# Altium footprint library Connectors THD.PcbLib: 631 footprints (part 41 of 46)
Each footprint in its own frame and in the unit in brackets; x right, y up, seen from the top. Pads: shape width x height; smd on the part's side, far side on the other; paste and mask are expansions set on the pad; w line width, h text height; cw(c..) or ccw(c..) is an arc to the next point about the centre after c.
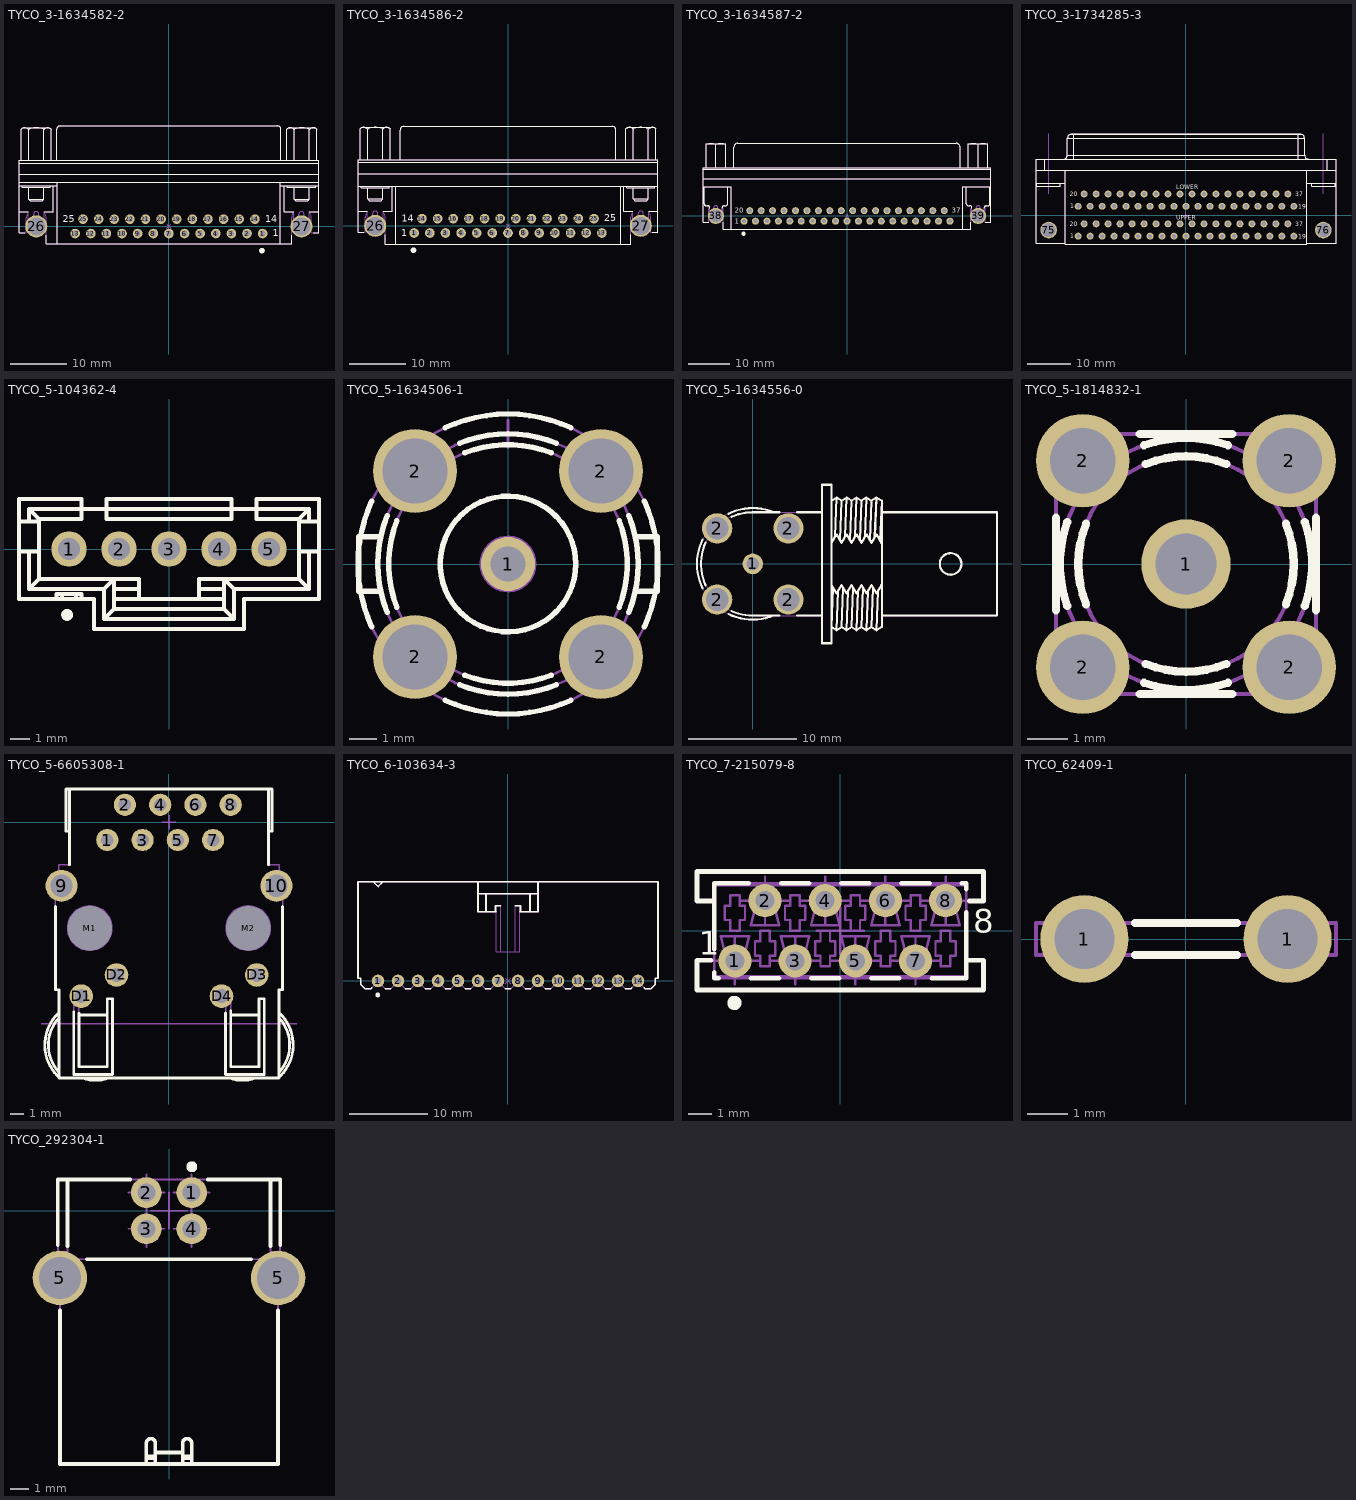
[diagram p40: the footprints below, top view; thin cyan lines are the x and y axes]

## TYCO_3-1634582-2 [mm] "Right Angle 25 Male Contacts D-SUB Connector With Boardlock and 4-40 UNC Screwlocks"
height 13.575
pads (27):
  round 1.7 hole 1: 1(16.62,-1.27) 2(13.85,-1.27) 3(11.08,-1.27) 4(8.31,-1.27) 5(5.54,-1.27) 6(2.77,-1.27) 7(0,-1.27) 8(-2.77,-1.27) 9(-5.54,-1.27) 10(-8.31,-1.27) 11(-11.08,-1.27) 12(-13.85,-1.27) 13(-16.62,-1.27) 14(15.235,1.27) 15(12.465,1.27) 16(9.695,1.27) 17(6.925,1.27) 18(4.155,1.27) 19(1.385,1.27) 20(-1.385,1.27) 21(-4.155,1.27) 22(-6.925,1.27) 23(-9.695,1.27) 24(-12.465,1.27) 25(-15.235,1.27)
  round 3.9 hole 3.2: 26(-23.52,0) 27(23.52,0)
Top Overlay:
  circle w0.5: c16.495,-4.305 r0.25
  lines w0.2: -26.567,2.62 -24.927,2.62 ; -26.567,7.21 -19.772,7.21 ; -26.567,7.85 26.533,7.85 ; -26.567,11.23 26.533,11.23 ; -26.525,9.2 26.533,9.2 ; -26.187,11.7 -26.187,17.2 -25.887,17.5 -21.187,17.5 -20.889,17.2 ; -26.184,17.2 cw(c-25.495,16.568) -25.572,17.5 cw(c-25.649,16.568) -24.959,17.2 -24.761,17.2 cw(c-23.537,14.767) -22.312,17.2 -22.114,17.2 cw(c-21.424,16.568) -21.501,17.5 cw(c-21.579,16.568) -20.889,17.2 ; -26.037,7.21 -26.037,6.96 -21.037,6.96 -21.037,7.21 ; -25.569,-1.15 -26.567,-1.15 -26.567,11.7 26.533,11.7 26.533,-1.15 25.569,-1.15 ; -24.877,6.96 -24.877,4.8 ; -24.862,11.7 -24.862,17.2 ; -22.212,11.7 -22.212,17.2 ; -22.197,6.96 -22.197,4.8 ; -22.147,2.62 -20.507,2.62 -20.507,7.21 ; -21.777,-1.576 -21.777,-3.08 21.743,-3.08 21.743,-1.538 ; -20.889,11.7 -20.889,17.2 ; -19.894,11.7 -19.894,17.2 cw(c-19.294,17.2) -19.294,17.8 19.263,17.8 cw(c19.263,17.2) 19.863,17.2 19.863,11.7 ; -19.772,-3.08 -19.772,7.85 ; 19.738,-3.08 19.738,7.85 ; 19.738,7.21 26.533,7.21 ; 20.473,7.21 20.473,2.62 22.113,2.62 ; 20.913,11.7 20.913,17.209 21.213,17.509 25.913,17.509 26.211,17.209 ; 20.916,17.209 cw(c21.605,16.577) 21.528,17.509 cw(c21.451,16.577) 22.141,17.209 22.339,17.209 cw(c23.563,14.777) 24.788,17.209 24.986,17.209 cw(c25.676,16.577) 25.599,17.509 cw(c25.522,16.577) 26.211,17.209 ; 21.003,7.21 21.003,6.96 26.003,6.96 26.003,7.21 ; 22.223,6.96 22.223,4.8 ; 22.238,11.7 22.238,17.209 ; 24.888,11.7 24.888,17.209 ; 24.893,2.62 26.533,2.62 ; 24.903,6.96 24.903,4.8 ; 26.211,11.7 26.211,17.209 ; -24.877,4.8 -24.577,4.5 -22.497,4.5 -22.197,4.8 ; -24.877,4.8 -22.197,4.8 ; 22.223,4.8 22.523,4.5 24.603,4.5 24.903,4.8 ; 22.223,4.8 24.903,4.8
  text "14" at 17.04,0.77 h1.2
  text "25" at -18.86,0.72 h1.2
  text "1" at 18.425,-1.77 h1.2
Mechanical 8:
  lines w0.1: -24.02,0 -23.52,0 ; -23.52,-0.5 -23.52,0 ; -23.52,0.5 -23.52,0 ; -23.02,0 -23.52,0 ; -17.12,-1.27 -16.62,-1.27 ; -16.62,-1.77 -16.62,-1.27 ; -16.62,-0.77 -16.62,-1.27 ; -16.12,-1.27 -16.62,-1.27 ; -15.735,1.27 -15.235,1.27 ; -15.235,0.77 -15.235,1.27 ; -15.235,1.77 -15.235,1.27 ; -14.735,1.27 -15.235,1.27 ; -14.35,-1.27 -13.85,-1.27 ; -13.85,-1.77 -13.85,-1.27 ; -13.85,-0.77 -13.85,-1.27 ; -13.35,-1.27 -13.85,-1.27 ; -12.965,1.27 -12.465,1.27 ; -12.465,0.77 -12.465,1.27 ; -12.465,1.77 -12.465,1.27 ; -11.965,1.27 -12.465,1.27 ; -11.58,-1.27 -11.08,-1.27 ; -11.08,-1.77 -11.08,-1.27 ; -11.08,-0.77 -11.08,-1.27 ; -10.58,-1.27 -11.08,-1.27 ; -10.195,1.27 -9.695,1.27 ; -9.695,0.77 -9.695,1.27 ; -9.695,1.77 -9.695,1.27 ; -9.195,1.27 -9.695,1.27 ; -8.81,-1.27 -8.31,-1.27 ; -8.31,-1.77 -8.31,-1.27 ; -8.31,-0.77 -8.31,-1.27 ; -7.81,-1.27 -8.31,-1.27 ; -7.425,1.27 -6.925,1.27 ; -6.925,0.77 -6.925,1.27 ; -6.925,1.77 -6.925,1.27 ; -6.425,1.27 -6.925,1.27 ; -6.04,-1.27 -5.54,-1.27 ; -5.54,-1.77 -5.54,-1.27 ; -5.54,-0.77 -5.54,-1.27 ; -5.04,-1.27 -5.54,-1.27 ; -4.655,1.27 -4.155,1.27 ; -4.155,0.77 -4.155,1.27 ; -4.155,1.77 -4.155,1.27 ; -3.655,1.27 -4.155,1.27 ; -3.27,-1.27 -2.77,-1.27 ; -2.77,-1.77 -2.77,-1.27 ; -2.77,-0.77 -2.77,-1.27 ; -2.27,-1.27 -2.77,-1.27 ; -1.885,1.27 -1.385,1.27 ; -1.385,0.77 -1.385,1.27 ; -1.385,1.77 -1.385,1.27 ; -0.885,1.27 -1.385,1.27 ; -0.5,-1.27 0,-1.27 ; -0.354,-0.354 0,0 ; -0.354,0.354 0,0 ; 0,-1.77 0,-1.27 ; 0,-0.77 0,-1.27 ; 0.354,-0.354 0,0 ; 0.354,0.354 0,0 ; 0.5,-1.27 0,-1.27 ; 0.885,1.27 1.385,1.27 ; 1.385,0.77 1.385,1.27 ; 1.385,1.77 1.385,1.27 ; 1.885,1.27 1.385,1.27 ; 2.27,-1.27 2.77,-1.27 ; 2.77,-1.77 2.77,-1.27 ; 2.77,-0.77 2.77,-1.27 ; 3.27,-1.27 2.77,-1.27 ; 3.655,1.27 4.155,1.27 ; 4.155,0.77 4.155,1.27 ; 4.155,1.77 4.155,1.27 ; 4.655,1.27 4.155,1.27 ; 5.04,-1.27 5.54,-1.27 ; 5.54,-1.77 5.54,-1.27 ; 5.54,-0.77 5.54,-1.27 ; 6.04,-1.27 5.54,-1.27 ; 6.425,1.27 6.925,1.27 ; 6.925,0.77 6.925,1.27 ; 6.925,1.77 6.925,1.27 ; 7.425,1.27 6.925,1.27 ; 7.81,-1.27 8.31,-1.27 ; 8.31,-1.77 8.31,-1.27 ; 8.31,-0.77 8.31,-1.27 ; 8.81,-1.27 8.31,-1.27 ; 9.195,1.27 9.695,1.27 ; 9.695,0.77 9.695,1.27 ; 9.695,1.77 9.695,1.27 ; 10.195,1.27 9.695,1.27 ; 10.58,-1.27 11.08,-1.27 ; 11.08,-1.77 11.08,-1.27 ; 11.08,-0.77 11.08,-1.27 ; 11.58,-1.27 11.08,-1.27 ; 11.965,1.27 12.465,1.27 ; 12.465,0.77 12.465,1.27 ; 12.465,1.77 12.465,1.27 ; 12.965,1.27 12.465,1.27 ; 13.35,-1.27 13.85,-1.27 ; 13.85,-1.77 13.85,-1.27 ; 13.85,-0.77 13.85,-1.27 ; 14.35,-1.27 13.85,-1.27 ; 14.735,1.27 15.235,1.27 ; 15.235,0.77 15.235,1.27 ; 15.235,1.77 15.235,1.27 ; 15.735,1.27 15.235,1.27 ; 16.12,-1.27 16.62,-1.27 ; 16.62,-1.77 16.62,-1.27 ; 16.62,-0.77 16.62,-1.27 ; 17.12,-1.27 16.62,-1.27 ; 23.02,0 23.52,0 ; 23.52,-0.5 23.52,0 ; 23.52,0.5 23.52,0 ; 24.02,0 23.52,0
Mechanical 14:
  lines w0.1: -26.567,2.62 -24.927,2.62 -24.927,-0.32 -23.987,-0.32 -23.987,2.17 cw(c-23.537,2.17) -23.087,2.17 -23.087,-0.32 -22.147,-0.32 -22.147,2.62 -20.507,2.62 -20.507,7.21 ; -26.567,7.21 -19.772,7.21 ; -26.567,7.85 26.533,7.85 ; -26.567,11.23 26.533,11.23 ; -26.525,9.2 26.533,9.2 ; -26.187,11.7 -26.187,17.2 -25.887,17.5 -21.187,17.5 -20.889,17.2 ; -26.184,17.2 cw(c-25.495,16.568) -25.572,17.5 cw(c-25.649,16.568) -24.959,17.2 -24.761,17.2 cw(c-23.537,14.767) -22.312,17.2 -22.114,17.2 cw(c-21.424,16.568) -21.501,17.5 cw(c-21.579,16.568) -20.889,17.2 ; -26.037,7.21 -26.037,6.96 -21.037,6.96 -21.037,7.21 ; -24.927,2.6 ccw(c-23.537,1.52) -25.297,1.52 -25.297,-1.15 -26.567,-1.15 -26.567,11.7 26.533,11.7 26.533,-1.15 25.263,-1.15 25.263,1.52 ccw(c23.503,1.52) 24.893,2.6 ; -24.877,6.96 -24.877,4.8 ; -24.862,11.7 -24.862,17.2 ; -22.212,11.7 -22.212,17.2 ; -22.197,6.96 -22.197,4.8 ; -22.147,2.6 cw(c-23.537,1.52) -21.777,1.52 -21.777,-3.08 21.743,-3.08 21.743,1.52 cw(c23.503,1.52) 22.113,2.6 ; -20.889,11.7 -20.889,17.2 ; -19.894,11.7 -19.894,17.2 cw(c-19.294,17.2) -19.294,17.8 19.263,17.8 cw(c19.263,17.2) 19.863,17.2 19.863,11.7 ; -19.772,-3.08 -19.772,7.85 ; 19.738,-3.08 19.738,7.85 ; 19.738,7.21 26.533,7.21 ; 20.473,7.21 20.473,2.62 22.113,2.62 22.113,-0.318 23.053,-0.32 23.053,2.17 cw(c23.503,2.17) 23.953,2.17 23.953,-0.32 24.893,-0.32 24.893,2.62 26.533,2.62 ; 20.913,11.7 20.913,17.209 21.213,17.509 25.913,17.509 26.211,17.209 ; 20.916,17.209 cw(c21.605,16.577) 21.528,17.509 cw(c21.451,16.577) 22.141,17.209 22.339,17.209 cw(c23.563,14.777) 24.788,17.209 24.986,17.209 cw(c25.676,16.577) 25.599,17.509 cw(c25.522,16.577) 26.211,17.209 ; 21.003,7.21 21.003,6.96 26.003,6.96 26.003,7.21 ; 22.223,6.96 22.223,4.8 ; 22.238,11.7 22.238,17.209 ; 24.888,11.7 24.888,17.209 ; 24.903,6.96 24.903,4.8 ; 26.211,11.7 26.211,17.209 ; -24.877,4.8 -24.577,4.5 -22.497,4.5 -22.197,4.8 ; -24.877,4.8 -22.197,4.8 ; 22.223,4.8 22.523,4.5 24.603,4.5 24.903,4.8 ; 22.223,4.8 24.903,4.8
  text "14" at 17.04,0.77 h1.2
  text "25" at -18.86,0.72 h1.2
  text "1" at 18.425,-1.77 h1.2
3D body: height 13.57, standoff -3.8, extent -26.567,-3.08 26.533,17.8

## TYCO_3-1634586-2 [mm] "Right Angle 25 Female Contacts D-SUB Connector With Boardlock and 4-40 UNC Screwlocks"
height 13.575
pads (27):
  round 1.7 hole 1: 1(-16.62,-1.27) 2(-13.85,-1.27) 3(-11.08,-1.27) 4(-8.31,-1.27) 5(-5.54,-1.27) 6(-2.77,-1.27) 7(0,-1.27) 8(2.77,-1.27) 9(5.54,-1.27) 10(8.31,-1.27) 11(11.08,-1.27) 12(13.85,-1.27) 13(16.62,-1.27) 14(-15.235,1.27) 15(-12.465,1.27) 16(-9.695,1.27) 17(-6.925,1.27) 18(-4.155,1.27) 19(-1.385,1.27) 20(1.385,1.27) 21(4.155,1.27) 22(6.925,1.27) 23(9.695,1.27) 24(12.465,1.27) 25(15.235,1.27)
  round 3.9 hole 3.2: 26(-23.52,0) 27(23.52,0)
Top Overlay:
  circle w0.5: c-16.745,-4.305 r0.25
  lines w0.2: -26.55,2.62 -24.91,2.62 ; -26.55,7.01 26.55,7.01 ; -26.55,11.23 26.55,11.23 ; -26.508,9.2 26.55,9.2 ; -26.17,11.7 -26.17,17.15 -25.87,17.45 -21.17,17.45 -20.872,17.15 ; -26.168,17.15 cw(c-25.478,16.518) -25.555,17.45 cw(c-25.632,16.518) -24.943,17.15 -24.745,17.15 cw(c-23.52,14.717) -22.295,17.15 -22.097,17.15 cw(c-21.408,16.518) -21.485,17.45 cw(c-21.562,16.518) -20.872,17.15 ; -26.02,7.01 -26.02,6.76 -21.02,6.76 -21.02,7.01 ; -25.569,-1.15 -26.55,-1.15 -26.55,11.7 26.55,11.7 26.55,-1.15 25.569,-1.15 ; -24.86,6.76 -24.86,4.76 ; -24.845,11.7 -24.845,17.15 ; -22.195,11.7 -22.195,17.15 ; -22.18,6.76 -22.18,4.76 ; -22.13,2.62 -20.49,2.62 -20.49,7.01 ; -21.76,-1.557 -21.76,-3.28 21.76,-3.28 21.76,-1.557 ; -20.872,11.7 -20.872,17.15 ; -19.89,-3.28 -19.89,7.01 ; -19.11,11.7 -19.11,16.93 cw(c-18.445,16.935) -18.45,17.6 18.45,17.6 cw(c18.445,16.935) 19.11,16.93 19.11,11.7 ; 19.93,-3.28 19.93,7.01 ; 20.49,7.01 20.49,2.62 22.13,2.62 ; 20.87,11.7 20.87,17.15 21.17,17.45 25.87,17.45 26.168,17.15 ; 20.872,17.15 cw(c21.562,16.518) 21.485,17.45 cw(c21.408,16.518) 22.097,17.15 22.295,17.15 cw(c23.52,14.717) 24.745,17.15 24.943,17.15 cw(c25.632,16.518) 25.555,17.45 cw(c25.478,16.518) 26.168,17.15 ; 21.02,7.01 21.02,6.76 26.02,6.76 26.02,7.01 ; 22.18,6.76 22.18,4.76 ; 22.195,11.7 22.195,17.15 ; 24.845,11.7 24.845,17.15 ; 24.86,6.76 24.86,4.76 ; 24.91,2.62 26.55,2.62 ; 26.168,11.7 26.168,17.15 ; -24.86,4.76 -22.18,4.76 ; -24.86,4.76 -24.56,4.46 -22.48,4.46 -22.18,4.76 ; 22.18,4.76 24.86,4.76 ; 22.18,4.76 22.48,4.46 24.56,4.46 24.86,4.76
  text "25" at 17.04,0.77 h1.2
  text "14" at -18.86,0.72 h1.2
  text "1" at -18.885,-1.88 h1.2
Mechanical 8:
  lines w0.1: -24.02,0 -23.52,0 ; -23.52,-0.5 -23.52,0 ; -23.52,0.5 -23.52,0 ; -23.02,0 -23.52,0 ; -17.12,-1.27 -16.62,-1.27 ; -16.62,-1.77 -16.62,-1.27 ; -16.62,-0.77 -16.62,-1.27 ; -16.12,-1.27 -16.62,-1.27 ; -15.735,1.27 -15.235,1.27 ; -15.235,0.77 -15.235,1.27 ; -15.235,1.77 -15.235,1.27 ; -14.735,1.27 -15.235,1.27 ; -14.35,-1.27 -13.85,-1.27 ; -13.85,-1.77 -13.85,-1.27 ; -13.85,-0.77 -13.85,-1.27 ; -13.35,-1.27 -13.85,-1.27 ; -12.965,1.27 -12.465,1.27 ; -12.465,0.77 -12.465,1.27 ; -12.465,1.77 -12.465,1.27 ; -11.965,1.27 -12.465,1.27 ; -11.58,-1.27 -11.08,-1.27 ; -11.08,-1.77 -11.08,-1.27 ; -11.08,-0.77 -11.08,-1.27 ; -10.58,-1.27 -11.08,-1.27 ; -10.195,1.27 -9.695,1.27 ; -9.695,0.77 -9.695,1.27 ; -9.695,1.77 -9.695,1.27 ; -9.195,1.27 -9.695,1.27 ; -8.81,-1.27 -8.31,-1.27 ; -8.31,-1.77 -8.31,-1.27 ; -8.31,-0.77 -8.31,-1.27 ; -7.81,-1.27 -8.31,-1.27 ; -7.425,1.27 -6.925,1.27 ; -6.925,0.77 -6.925,1.27 ; -6.925,1.77 -6.925,1.27 ; -6.425,1.27 -6.925,1.27 ; -6.04,-1.27 -5.54,-1.27 ; -5.54,-1.77 -5.54,-1.27 ; -5.54,-0.77 -5.54,-1.27 ; -5.04,-1.27 -5.54,-1.27 ; -4.655,1.27 -4.155,1.27 ; -4.155,0.77 -4.155,1.27 ; -4.155,1.77 -4.155,1.27 ; -3.655,1.27 -4.155,1.27 ; -3.27,-1.27 -2.77,-1.27 ; -2.77,-1.77 -2.77,-1.27 ; -2.77,-0.77 -2.77,-1.27 ; -2.27,-1.27 -2.77,-1.27 ; -1.885,1.27 -1.385,1.27 ; -1.385,0.77 -1.385,1.27 ; -1.385,1.77 -1.385,1.27 ; -0.885,1.27 -1.385,1.27 ; -0.5,-1.27 0,-1.27 ; -0.354,-0.354 0,0 ; -0.354,0.354 0,0 ; 0,-1.77 0,-1.27 ; 0,-0.77 0,-1.27 ; 0.354,-0.354 0,0 ; 0.354,0.354 0,0 ; 0.5,-1.27 0,-1.27 ; 0.885,1.27 1.385,1.27 ; 1.385,0.77 1.385,1.27 ; 1.385,1.77 1.385,1.27 ; 1.885,1.27 1.385,1.27 ; 2.27,-1.27 2.77,-1.27 ; 2.77,-1.77 2.77,-1.27 ; 2.77,-0.77 2.77,-1.27 ; 3.27,-1.27 2.77,-1.27 ; 3.655,1.27 4.155,1.27 ; 4.155,0.77 4.155,1.27 ; 4.155,1.77 4.155,1.27 ; 4.655,1.27 4.155,1.27 ; 5.04,-1.27 5.54,-1.27 ; 5.54,-1.77 5.54,-1.27 ; 5.54,-0.77 5.54,-1.27 ; 6.04,-1.27 5.54,-1.27 ; 6.425,1.27 6.925,1.27 ; 6.925,0.77 6.925,1.27 ; 6.925,1.77 6.925,1.27 ; 7.425,1.27 6.925,1.27 ; 7.81,-1.27 8.31,-1.27 ; 8.31,-1.77 8.31,-1.27 ; 8.31,-0.77 8.31,-1.27 ; 8.81,-1.27 8.31,-1.27 ; 9.195,1.27 9.695,1.27 ; 9.695,0.77 9.695,1.27 ; 9.695,1.77 9.695,1.27 ; 10.195,1.27 9.695,1.27 ; 10.58,-1.27 11.08,-1.27 ; 11.08,-1.77 11.08,-1.27 ; 11.08,-0.77 11.08,-1.27 ; 11.58,-1.27 11.08,-1.27 ; 11.965,1.27 12.465,1.27 ; 12.465,0.77 12.465,1.27 ; 12.465,1.77 12.465,1.27 ; 12.965,1.27 12.465,1.27 ; 13.35,-1.27 13.85,-1.27 ; 13.85,-1.77 13.85,-1.27 ; 13.85,-0.77 13.85,-1.27 ; 14.35,-1.27 13.85,-1.27 ; 14.735,1.27 15.235,1.27 ; 15.235,0.77 15.235,1.27 ; 15.235,1.77 15.235,1.27 ; 15.735,1.27 15.235,1.27 ; 16.12,-1.27 16.62,-1.27 ; 16.62,-1.77 16.62,-1.27 ; 16.62,-0.77 16.62,-1.27 ; 17.12,-1.27 16.62,-1.27 ; 23.02,0 23.52,0 ; 23.52,-0.5 23.52,0 ; 23.52,0.5 23.52,0 ; 24.02,0 23.52,0
Mechanical 14:
  lines w0.1: -26.55,2.62 -24.91,2.62 -24.91,-0.318 -23.97,-0.32 -23.97,2.17 cw(c-23.52,2.17) -23.07,2.17 -23.07,-0.316 -22.13,-0.32 -22.13,2.62 -20.49,2.62 -20.49,7.01 ; -26.55,7.01 26.55,7.01 ; -26.55,11.23 26.55,11.23 ; -26.508,9.2 26.55,9.2 ; -26.17,11.7 -26.17,17.15 -25.87,17.45 -21.17,17.45 -20.872,17.15 ; -26.168,17.15 cw(c-25.478,16.518) -25.555,17.45 cw(c-25.632,16.518) -24.943,17.15 -24.745,17.15 cw(c-23.52,14.717) -22.295,17.15 -22.097,17.15 cw(c-21.408,16.518) -21.485,17.45 cw(c-21.562,16.518) -20.872,17.15 ; -26.02,7.01 -26.02,6.76 -21.02,6.76 -21.02,7.01 ; -24.91,2.6 ccw(c-23.52,1.52) -25.28,1.52 -25.28,-1.15 -26.55,-1.15 -26.55,11.7 26.55,11.7 26.55,-1.15 25.28,-1.15 25.28,1.52 ccw(c23.52,1.52) 24.91,2.6 ; -24.86,6.76 -24.86,4.76 ; -24.845,11.7 -24.845,17.15 ; -22.195,11.7 -22.195,17.15 ; -22.18,6.76 -22.18,4.76 ; -22.13,2.6 cw(c-23.52,1.52) -21.76,1.52 -21.76,-3.28 21.76,-3.28 21.76,1.52 cw(c23.52,1.52) 22.13,2.6 ; -20.872,11.7 -20.872,17.15 ; -19.89,-3.28 -19.89,7.01 ; -19.11,11.7 -19.11,16.93 cw(c-18.445,16.935) -18.45,17.6 18.45,17.6 cw(c18.445,16.935) 19.11,16.93 19.11,11.7 ; 19.93,-3.28 19.93,7.01 ; 20.49,7.01 20.49,2.62 22.13,2.62 22.13,-0.32 23.07,-0.32 23.07,2.17 cw(c23.52,2.17) 23.97,2.17 23.97,-0.32 24.91,-0.32 24.91,2.62 26.55,2.62 ; 20.87,11.7 20.87,17.15 21.17,17.45 25.87,17.45 26.168,17.15 ; 20.872,17.15 cw(c21.562,16.518) 21.485,17.45 cw(c21.408,16.518) 22.097,17.15 22.295,17.15 cw(c23.52,14.717) 24.745,17.15 24.943,17.15 cw(c25.632,16.518) 25.555,17.45 cw(c25.478,16.518) 26.168,17.15 ; 21.02,7.01 21.02,6.76 26.02,6.76 26.02,7.01 ; 22.18,6.76 22.18,4.76 ; 22.195,11.7 22.195,17.15 ; 24.845,11.7 24.845,17.15 ; 24.86,6.76 24.86,4.76 ; 26.168,11.7 26.168,17.15 ; -24.86,4.76 -22.18,4.76 ; -24.86,4.76 -24.56,4.46 -22.48,4.46 -22.18,4.76 ; 22.18,4.76 24.86,4.76 ; 22.18,4.76 22.48,4.46 24.56,4.46 24.86,4.76
  text "25" at 17.04,0.77 h1.2
  text "14" at -18.86,0.72 h1.2
  text "1" at -18.885,-1.88 h1.2
3D body: height 13.57, standoff -3.77, extent -26.55,-3.28 26.55,17.6

## TYCO_3-1634587-2 [mm] "Right Angle 37 Female Contacts D-SUB Connector With Boardlock and 4-40 UNC Screwlocks"
height 13.57
pads (39):
  round 1.7 hole 1: 1(-24.93,-1.27) 2(-22.16,-1.27) 3(-19.39,-1.27) 4(-16.62,-1.27) 5(-13.85,-1.27) 6(-11.08,-1.27) 7(-8.31,-1.27) 8(-5.54,-1.27) 9(-2.77,-1.27) 10(0,-1.27) 11(2.77,-1.27) 12(5.54,-1.27) 13(8.31,-1.27) 14(11.08,-1.27) 15(13.85,-1.27) 16(16.62,-1.27) 17(19.39,-1.27) 18(22.16,-1.27) 19(24.93,-1.27) 20(-23.545,1.27) 21(-20.775,1.27) 22(-18.005,1.27) 23(-15.235,1.27) 24(-12.465,1.27) 25(-9.695,1.27) 26(-6.925,1.27) 27(-4.155,1.27) 28(-1.385,1.27) 29(1.385,1.27) 30(4.155,1.27) 31(6.925,1.27) 32(9.695,1.27) 33(12.465,1.27) 34(15.235,1.27) 35(18.005,1.27) 36(20.775,1.27) 37(23.545,1.27)
  round 3.9 hole 3.2: 38(-31.75,0) 39(31.75,0)
Top Overlay:
  circle w0.5: c-25.055,-4.305 r0.25
  lines w0.2: -34.75,7.12 -28,7.12 -28,-3.28 ; -34.75,9.02 34.75,9.02 ; -34.75,11.33 -34.75,11.7 ; -34.726,11.33 34.75,11.33 ; -34.6,7.12 -34.6,2.97 ccw(c-34.1,2.97) -34.1,2.47 -33.75,2.47 cw(c-33.75,1.97) -33.25,1.97 -33.25,1.809 ; -34.1,11.7 -34.1,17.5 -29.4,17.5 -29.4,11.7 ; -34.1,17.284 cw(c-32.925,14.1) -31.75,17.284 ; -33.5,-1.48 -34.75,-1.48 -34.75,11.7 ; -31.75,11.7 -31.75,17.284 ; -30.25,1.809 -30.25,1.97 cw(c-29.75,1.97) -29.75,2.47 -29.4,2.47 ccw(c-29.4,2.97) -28.9,2.97 -28.9,7.12 ; -30,-1.568 -30,-3.28 30,-3.28 30,-1.568 ; -29.4,17.284 ccw(c-30.575,14.1) -31.75,17.284 ; -27.4,11.7 -27.4,16.6 cw(c-26.4,16.6) -26.4,17.6 26.4,17.6 cw(c26.4,16.6) 27.4,16.6 27.4,11.7 ; 28,-3.28 28,7.12 34.75,7.12 ; 28.9,7.12 28.9,2.97 ccw(c29.4,2.97) 29.4,2.47 29.75,2.47 cw(c29.75,1.97) 30.25,1.97 30.25,1.809 ; 29.4,11.7 29.4,17.5 34.1,17.5 34.1,11.7 ; 29.4,17.284 cw(c30.575,14.1) 31.75,17.284 ; 31.75,11.7 31.75,17.284 ; 33.25,1.809 33.25,1.97 cw(c33.75,1.97) 33.75,2.47 34.1,2.47 ccw(c34.1,2.97) 34.6,2.97 34.6,7.12 ; 33.5,-1.48 34.75,-1.48 34.75,11.7 -34.75,11.7 ; 34.1,17.284 ccw(c32.925,14.1) 31.75,17.284
  text "20" at -27.17,0.72 h1.2
  text "1" at -27.195,-1.88 h1.2
  text "37" at 25.35,0.77 h1.2
Mechanical 8:
  drawing of 160 lines, arcs and shapes, not listed
Mechanical 14:
  lines w0.1: -34.75,7.12 -28,7.12 -28,-3.28 ; -34.75,9.02 34.75,9.02 ; -34.75,11.33 -34.75,11.7 ; -34.726,11.33 34.75,11.33 ; -34.6,7.12 -34.6,2.97 ccw(c-34.1,2.97) -34.1,2.47 -33.75,2.47 cw(c-33.75,1.97) -33.25,1.97 -33.25,-0.305 -32.25,-0.305 -32.25,1.97 cw(c-31.75,1.97) -31.25,1.97 -31.25,-0.305 -30.25,-0.305 -30.25,1.97 cw(c-29.75,1.97) -29.75,2.47 -29.4,2.47 ccw(c-29.4,2.97) -28.9,2.97 -28.9,7.12 ; -34.1,11.7 -34.1,17.5 -29.4,17.5 -29.4,11.7 ; -34.1,17.284 cw(c-32.925,14.1) -31.75,17.284 ; -33.383,2.309 ccw(c-31.75,1.68) -33.5,1.68 -33.5,-1.48 -34.75,-1.48 -34.75,11.7 ; -31.75,11.7 -31.75,17.284 ; -30.117,2.309 cw(c-31.75,1.68) -30,1.68 -30,-3.28 30,-3.28 30,1.68 cw(c31.75,1.68) 30.117,2.309 ; -29.4,17.284 ccw(c-30.575,14.1) -31.75,17.284 ; -27.4,11.7 -27.4,16.6 cw(c-26.4,16.6) -26.4,17.6 26.4,17.6 cw(c26.4,16.6) 27.4,16.6 27.4,11.7 ; 28,-3.28 28,7.12 34.75,7.12 ; 28.9,7.12 28.9,2.97 ccw(c29.4,2.97) 29.4,2.47 29.75,2.47 cw(c29.75,1.97) 30.25,1.97 30.25,-0.305 31.25,-0.305 31.25,1.97 cw(c31.75,1.97) 32.25,1.97 32.25,-0.305 33.25,-0.305 33.25,1.97 cw(c33.75,1.97) 33.75,2.47 34.1,2.47 ccw(c34.1,2.97) 34.6,2.97 34.6,7.12 ; 29.4,11.7 29.4,17.5 34.1,17.5 34.1,11.7 ; 29.4,17.284 cw(c30.575,14.1) 31.75,17.284 ; 31.75,11.7 31.75,17.284 ; 33.383,2.309 cw(c31.75,1.68) 33.5,1.68 33.5,-1.48 34.75,-1.48 34.75,11.7 -34.75,11.7 ; 34.1,17.284 ccw(c32.925,14.1) 31.75,17.284
  text "20" at -27.17,0.72 h1.2
  text "1" at -27.195,-1.88 h1.2
  text "37" at 25.35,0.77 h1.2
3D body: height 13.57, standoff -3.8, extent -34.75,-3.28 34.75,17.6

## TYCO_3-1734285-3 [mm] "AMPLIMITE HD-20 - Dual Stacked 37 Pins Right Angled D Subminiature Female Connector"
height 31.98
pads (76):
  round 3.84 hole 3.2: 75(-31.75,-3.455) 76(31.75,-3.455)
  round 1.6 hole 1: L1(-24.93,2.035) L2(-22.16,2.035) L3(-19.39,2.035) L4(-16.62,2.035) L5(-13.85,2.035) L6(-11.08,2.035) L7(-8.31,2.035) L8(-5.54,2.035) L9(-2.77,2.035) L10(0,2.035) L11(2.77,2.035) L12(5.54,2.035) L13(8.31,2.035) L14(11.08,2.035) L15(13.85,2.035) L16(16.62,2.035) L17(19.39,2.035) L18(22.16,2.035) L19(24.93,2.035) L20(-23.545,4.875) L21(-20.775,4.875) L22(-18.005,4.875) L23(-15.235,4.875) L24(-12.465,4.875) L25(-9.695,4.875) L26(-6.925,4.875) L27(-4.155,4.875) L28(-1.385,4.875) L29(1.385,4.875) L30(4.155,4.875) L31(6.925,4.875) L32(9.695,4.875) L33(12.465,4.875) L34(15.235,4.875) L35(18.005,4.875) L36(20.8,4.89) L37(23.545,4.875) U1(-24.93,-4.875) U2(-22.16,-4.875) U3(-19.39,-4.875) U4(-16.62,-4.875) U5(-13.85,-4.875) U6(-11.08,-4.875) U7(-8.31,-4.875) U8(-5.54,-4.875) U9(-2.77,-4.875) U10(0,-4.875) U11(2.77,-4.875) U12(5.54,-4.875) U13(8.31,-4.875) U14(11.08,-4.875) U15(13.85,-4.875) U16(16.62,-4.875) U17(19.39,-4.875) U18(22.16,-4.875) U19(24.93,-4.875) U20(-23.545,-2.035) U21(-20.775,-2.035) U22(-18.005,-2.035) U23(-15.235,-2.035) U24(-12.465,-2.035) U25(-9.695,-2.035) U26(-6.925,-2.035) U27(-4.155,-2.035) U28(-1.385,-2.035) U29(1.385,-2.035) U30(4.155,-2.035) U31(6.925,-2.035) U32(9.695,-2.035) U33(12.465,-2.035) U34(15.235,-2.035) U35(18.005,-2.035) U36(20.775,-2.035) U37(23.545,-2.035)
Top Overlay:
  lines w0.2: -34.67,7.355 -27.92,7.355 ; -34.67,10.355 34.67,10.355 ; -34.45,7.355 -34.45,6.691 -29.05,6.691 -29.05,7.355 ; -32.67,10.355 -32.67,12.955 ; -28.219,12.959 ccw(c-28.3,13.855) -27.4,13.855 ; -27.92,-6.545 -34.67,-6.545 -34.67,12.955 34.67,12.955 34.67,-6.545 27.92,-6.545 ; -27.92,10.355 -27.92,-6.695 27.92,-6.695 27.92,10.355 ; -26.4,18.655 -26.4,18.755 26.4,18.755 26.4,18.655 ; -25.9,12.955 -25.9,18.755 ; 25.9,12.955 25.9,18.755 ; 27.92,7.355 34.67,7.355 ; 28.3,12.955 cw(c28.3,13.855) 27.4,13.855 ; 29.05,7.355 29.05,6.691 34.45,6.691 34.45,7.355 ; 32.67,10.355 32.67,12.955 ; -27.4,13.855 27.4,13.855 ; -27.4,13.855 -27.4,17.755 ; -27.4,17.755 cw(c-26.5,17.755) -26.5,18.655 26.499,18.655 cw(c26.5,17.755) 27.4,17.755 ; -27.4,17.755 27.4,17.755 ; 27.4,13.855 27.4,17.755
  text "1" at -26.7,-5.345 h1
  text "20" at -26.875,-2.545 h1
  text "37" at 25.3,-2.57 h1
  text "19" at 26,-5.47 h1
  text "19" at 26,1.44 h1
  text "37" at 25.3,4.34 h1
  text "20" at -26.875,4.365 h1
  text "1" at -26.7,1.565 h1
  text "UPPER" at -2.275,-1.03 h1
  text "LOWER" at -2.275,6.03 h1
Mechanical 8:
  lines w0.1: -34.67,12.955 34.67,12.955 ; -32.25,-3.455 -31.75,-3.455 ; -31.75,-3.955 -31.75,-3.455 ; -31.75,-2.955 -31.75,-3.455 ; -31.75,4.875 -31.75,18.755 ; -31.25,-3.455 -31.75,-3.455 ; -0.5,0 0,0 ; 0,-0.5 0,0 ; 0,0.5 0,0 ; 0.5,0 0,0 ; 31.25,-3.455 31.75,-3.455 ; 31.75,-3.955 31.75,-3.455 ; 31.75,-2.955 31.75,-3.455 ; 31.75,4.875 31.75,18.755 ; 32.25,-3.455 31.75,-3.455
  text "PCB EDGE" at -6,11.63 h1
Mechanical 14:
  lines w0.1: -34.67,7.355 -27.92,7.355 ; -34.67,10.355 34.67,10.355 ; -34.45,7.355 -34.45,6.691 -29.05,6.691 -29.05,7.355 ; -32.67,10.355 -32.67,12.955 ; -28.219,12.959 ccw(c-28.3,13.855) -27.4,13.855 ; -27.92,-6.545 -34.67,-6.545 -34.67,12.955 34.67,12.955 34.67,-6.545 27.92,-6.545 ; -27.92,10.355 -27.92,-6.695 27.92,-6.695 27.92,10.355 ; -26.4,18.655 -26.4,18.755 26.4,18.755 26.4,18.655 ; -25.9,12.955 -25.9,18.755 ; 25.9,12.955 25.9,18.755 ; 27.92,7.355 34.67,7.355 ; 28.3,12.955 cw(c28.3,13.855) 27.4,13.855 ; 29.05,7.355 29.05,6.691 34.45,6.691 34.45,7.355 ; 32.67,10.355 32.67,12.955 ; -27.4,13.855 27.4,13.855 ; -27.4,13.855 -27.4,17.755 ; -27.4,17.755 cw(c-26.5,17.755) -26.5,18.655 26.499,18.655 cw(c26.5,17.755) 27.4,17.755 ; -27.4,17.755 27.4,17.755 ; 27.4,13.855 27.4,17.755